# Altium footprint library Circuitos Integrados.PcbLib: 81 footprints (part 4 of 6)
Each footprint in its own frame and in the unit in brackets; x right, y up, seen from the top. Pads: shape width x height; smd on the part's side, far side on the other; paste and mask are expansions set on the pad; w line width, h text height; cw(c..) or ccw(c..) is an arc to the next point about the centre after c.
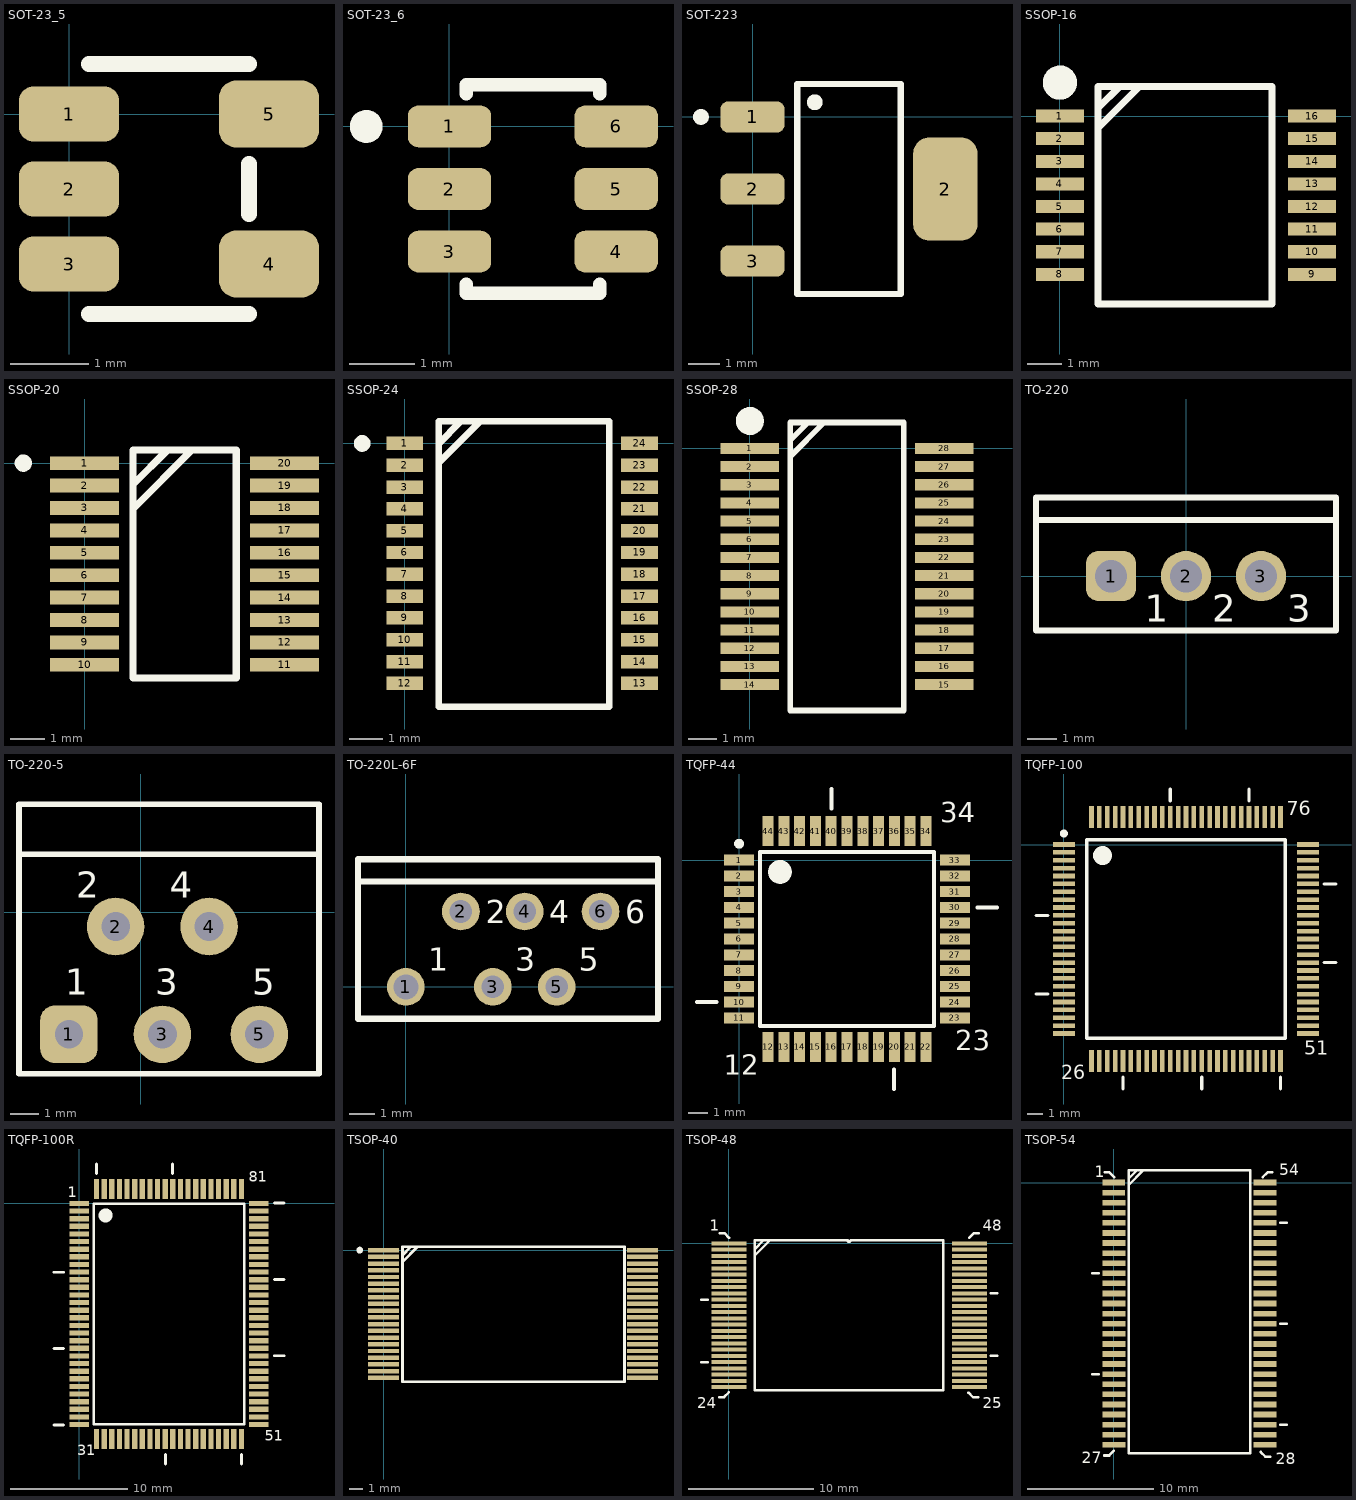
[diagram p3: the footprints below, top view; thin cyan lines are the x and y axes]

## SOT-23_5 [mm] "SOT-23, 5-Pins"
pads (5):
  rrect50% 1.27x0.7 smd: 1(0,0) 2(0,-0.953) 3(0,-1.905)
  rrect50% 1.27x0.85 smd: 4(2.54,-1.905) 5(2.54,0)
Top Overlay:
  lines w0.203: 0.254,-2.54 2.286,-2.54 ; 0.254,0.635 2.286,0.635 ; 2.286,-1.27 2.286,-0.635
3D body "SOT-23_5.STEP": height 1.1, standoff 0, extent -0.15,-2.4 2.65,0.499

## SOT-23_6 [mil] "SOT-23, 6-Pins"
pads (6):
  rrect50% 50x25 smd: 1(0,0) 2(0,-37.5) 3(0,-75) 4(100,-75) 5(100,-37.5) 6(100,0)
Top Overlay:
  circle w9.84: c-49.92,0 r4.92
  lines w8: 10,-94.69 10,-100 90,-100 90,-94.69 ; 10,19.68 10,25 90,25 90,19.68
3D body "SOT-23_6.STEP": height 43, standoff 0, extent 2.45,-92.52 97.95,17.48

## SOT-223 [mm] "SOT223, 4-Leads, Pitch 2,30mm,"
height 1.8
pads (4):
  rrect50% 2.05x1 smd: 1(0,0) 2(0,-2.3) 3(0,-4.6)
  rrect50% 2.05x3.3 smd: 2(6.15,-2.3)
Top Overlay:
  circle w0.25: c1.985,0.469 r0.125
  circle w0.25: c-1.649,0 r0.125
  lines w0.2: 1.425,-5.65 1.425,1.05 4.725,1.05 4.725,-5.65 1.425,-5.65
3D body "SOT-223.STEP": height 1.64, standoff -0.04, extent -0.442,-5.55 6.49,0.95

## SSOP-16 [mil]
pads (16):
  rect 55x15 smd: 1(0,0) 2(0,-26) 3(0,-52) 4(0,-78) 5(0,-104) 6(0,-130) 7(0,-156) 8(0,-182) 9(290,-182) 10(290,-156) 11(290,-130) 12(290,-104) 13(290,-78) 14(290,-52) 15(290,-26) 16(290,0)
Top Overlay:
  circle w19.68: c0,38.51 r9.84
  lines w8: 44,-13.48 91.48,34 ; 44,9.16 68.84,34 ; 44,-216 244,-216 244,34 44,34 44,-216
3D body "SSOP-16.STEP": height 78, standoff 0, extent -6.88,-214.51 304.12,34.45

## SSOP-20 [mm]
pads (20):
  rect 2x0.4 smd: 1(0,0) 2(0,-0.65) 3(0,-1.3) 4(0,-1.95) 5(0,-2.6) 6(0,-3.25) 7(0,-3.9) 8(0,-4.55) 9(0,-5.2) 10(0,-5.85) 11(5.8,-5.85) 12(5.8,-5.2) 13(5.8,-4.55) 14(5.8,-3.9) 15(5.8,-3.25) 16(5.8,-2.6) 17(5.8,-1.95) 18(5.8,-1.3) 19(5.8,-0.65) 20(5.8,0)
Top Overlay:
  circle w0.25: c-1.776,0 r0.125
  lines w0.203: 1.4,-1.325 3.1,0.375 ; 1.4,-0.625 2.4,0.375 ; 1.4,-6.225 1.4,0.375 4.4,0.375 4.4,-6.225 1.4,-6.225
3D body "TSSOP-20.STEP": height 0.97, standoff -0.03, extent -0.305,-6.175 6.105,0.325

## SSOP-24 [mm] "SSOP, 24-Leads, Body 8,7x5,4mm (max), Pitch 0,65mm, IPC Medium Density"
height 2
pads (24):
  rect 1.1x0.4 smd: 1(0,0) 2(0,-0.65) 3(0,-1.3) 4(0,-1.951) 5(0,-2.601) 6(0,-3.251) 7(0,-3.901) 8(0,-4.552) 9(0,-5.202) 10(0,-5.852) 11(0,-6.502) 12(0,-7.153) 13(7,-7.153) 14(7,-6.502) 15(7,-5.852) 16(7,-5.202) 17(7,-4.552) 18(7,-3.901) 19(7,-3.251) 20(7,-2.601) 21(7,-1.951) 22(7,-1.3) 23(7,-0.65) 24(7,0)
Top Overlay:
  circle w0.25: c-1.268,0 r0.125
  lines w0.203: 1.016,-0.571 2.222,0.635 ; 1.016,0.004 1.647,0.635 ; 1.016,-7.849 1.016,0.66 6.096,0.66 6.096,-7.849 1.016,-7.849
3D body "User Library-SOT340-1.STEP": height 1.85, standoff -0.05, extent -0.269,-7.698 7.28,0.535

## SSOP-28 [mm]
pads (28):
  rect 2.1x0.4 smd: 1(0,0) 2(0,-0.65) 3(0,-1.3) 4(0,-1.95) 5(0,-2.6) 6(0,-3.25) 7(0,-3.9) 8(0,-4.55) 9(0,-5.2) 10(0,-5.85) 11(0,-6.5) 12(0,-7.15) 13(0,-7.8) 14(0,-8.45) 15(6.95,-8.45) 16(6.95,-7.8) 17(6.95,-7.15) 18(6.95,-6.5) 19(6.95,-5.85) 20(6.95,-5.2) 21(6.95,-4.55) 22(6.95,-3.9) 23(6.95,-3.25) 24(6.95,-2.6) 25(6.95,-1.95) 26(6.95,-1.3) 27(6.95,-0.65) 28(6.95,0)
Top Overlay:
  circle w0.5: c0,0.978 r0.25
  lines w0.203: 1.45,-0.281 2.656,0.925 ; 1.45,0.294 2.081,0.925 ; 1.45,-9.375 5.5,-9.375 5.5,0.925 1.45,0.925 1.45,-9.375
3D body "SSOP-28.stp": height 1.95, standoff 0, extent -0.656,-9.492 7.569,1.008

## TO-220 [mm] "TO, Thru-Hole, Vertical, Heatsink Mounted; 3 In-Line Leads; Pitch 2.54 mm"
height 22.9
pads (3):
  rrect50% 1.7x1.7 hole 1.1: 1(-2.54,0)
  round 1.7 hole 1.1: 2(0,0) 3(2.54,0)
Top Overlay:
  lines w0.2: -5.08,1.905 5.08,1.905 ; -5.08,-1.85 -5.08,2.667 5.08,2.667 5.08,-1.85 -5.08,-1.85
  text "3" at 3.437,-1.539 h0.91
  text "2" at 0.897,-1.539 h0.91
  text "1" at -1.393,-1.539 h0.91
3D body "TO-220-4.STEP": height 20.06, standoff -8.74, extent -5.1,-1.833 5.1,2.667

## TO-220-5 [mil]
height 598.43
pads (5):
  rrect50% 80x80 hole 39.37: 1(-100,-170)
  round 80 hole 40: 2(-35,-20) 3(30,-170) 4(95,-20) 5(165,-170)
Top Overlay:
  lines w7.87: -169.45,80.55 247.87,80.55 ; -169.45,-225 -169.45,150.24 247.87,150.24 247.87,-225 -169.45,-225
  text "4" at 40,20 h36
  text "3" at 20,-115 h36
  text "2" at -90,20 h36
  text "5" at 155,-115 h36
  text "1" at -105,-115 h36
3D body "TO220-5.STEP": height 840.55, standoff -103.94, extent -170,-174.41 230,150

## TO-220L-6F [mm]
pads (6):
  round 1.5 hole 1: 1(0,0)
  round 1.5 hole 0.9: 2(2.19,3) 3(3.46,0) 4(4.73,3) 5(6,0) 6(7.747,3)
Top Overlay:
  lines w0.254: 10.033,4.191 -1.905,4.191 ; -1.905,4.191 -1.905,5.08 10.033,5.08 10.033,3.429 10.033,-1.27 -1.905,-1.27 -1.905,4.191
  text "6" at 8.732,2.54 h0.91
  text "4" at 5.715,2.54 h0.91
  text "2" at 3.175,2.54 h0.91
  text "3" at 4.349,0.635 h0.91
  text "5" at 6.889,0.635 h0.91
  text "1" at 0.889,0.635 h0.91

## TQFP-44 [mm] "TQFP, 44-Leads, Body 12,2x12,2mm (max), Pitch 0,80mm, IPC Medium Density"
height 1.2
pads (44):
  rect 1.52x0.56 smd: 1(0,0) 2(0,-0.8) 3(0,-1.6) 4(0,-2.4) 5(0,-3.2) 6(0,-4) 7(0,-4.8) 8(0,-5.6) 9(0,-6.4) 10(0,-7.2) 11(0,-8) 23(10.94,-8) 24(10.94,-7.2) 25(10.94,-6.4) 26(10.94,-5.6) 27(10.94,-4.8) 28(10.94,-4) 29(10.94,-3.2) 30(10.94,-2.4) 31(10.94,-1.6) 32(10.94,-0.8) 33(10.94,0)
  rect 0.56x1.52 smd: 12(1.47,-9.47) 13(2.27,-9.47) 14(3.07,-9.47) 15(3.87,-9.47) 16(4.67,-9.47) 17(5.47,-9.47) 18(6.27,-9.47) 19(7.07,-9.47) 20(7.87,-9.47) 21(8.67,-9.47) 22(9.47,-9.47) 34(9.47,1.47) 35(8.67,1.47) 36(7.87,1.47) 37(7.07,1.47) 38(6.27,1.47) 39(5.47,1.47) 40(4.67,1.47) 41(3.87,1.47) 42(3.07,1.47) 43(2.27,1.47) 44(1.47,1.47)
Top Overlay:
  circle w0.6: c2.07,-0.6 r0.3
  circle w0.25: c0,0.83 r0.125
  lines w0.2: 1.07,-8.4 9.87,-8.4 9.87,0.4 1.07,0.4 1.07,-8.4
  lines w0.203: -2.134,-7.188 -1.143,-7.188 ; 4.682,2.613 4.682,3.604 ; 7.858,-11.604 7.858,-10.613 ; 12.083,-2.412 13.074,-2.412
  text "34" at 10.185,1.93 h1.02
  text "23" at 10.947,-9.652 h1.02
  text "12" at -0.787,-10.871 h1.02
3D body "User Library-TQFP-44-1.STEP": height 1.1, standoff 0, extent -0.533,-9.988 11.467,2.012

## TQFP-100 [mm] "TQFP, 100-Leads, Body 16mm x 16mm x 1.6mm, Pitch 0,50mm"
height 1.6
pads (100):
  rect 1.4x0.3 smd: 1(0,0) 2(0,-0.5) 3(0,-1) 4(0,-1.5) 5(0,-2) 6(0,-2.5) 7(0,-3) 8(0,-3.5) 9(0,-4) 10(0,-4.5) 11(0,-5) 12(0,-5.5) 13(0,-6) 14(0,-6.5) 15(0,-7) 16(0,-7.5) 17(0,-8) 18(0,-8.5) 19(0,-9) 20(0,-9.5) 21(0,-10) 22(0,-10.5) 23(0,-11) 24(0,-11.5) 25(0,-12) 51(15.5,-12) 52(15.5,-11.5) 53(15.5,-11) 54(15.5,-10.5) 55(15.5,-10) 56(15.5,-9.5) 57(15.5,-9) 58(15.5,-8.5) 59(15.5,-8) 60(15.5,-7.5) 61(15.5,-7) 62(15.5,-6.5) 63(15.5,-6) 64(15.5,-5.5) 65(15.5,-5) 66(15.5,-4.5) 67(15.5,-4) 68(15.5,-3.5) 69(15.5,-3) 70(15.5,-2.5) 71(15.5,-2) 72(15.5,-1.5) 73(15.5,-1) 74(15.5,-0.5) 75(15.5,0)
  rect 0.3x1.4 smd: 26(1.75,-13.75) 27(2.25,-13.75) 28(2.75,-13.75) 29(3.25,-13.75) 30(3.75,-13.75) 31(4.25,-13.75) 32(4.75,-13.75) 33(5.25,-13.75) 34(5.75,-13.75) 35(6.25,-13.75) 36(6.75,-13.75) 37(7.25,-13.75) 38(7.75,-13.75) 39(8.25,-13.75) 40(8.75,-13.75) 41(9.25,-13.75) 42(9.75,-13.75) 43(10.25,-13.75) 44(10.75,-13.75) 45(11.25,-13.75) 46(11.75,-13.75) 47(12.25,-13.75) 48(12.75,-13.75) 49(13.25,-13.75) 50(13.75,-13.75) 76(13.75,1.75) 77(13.25,1.75) 78(12.75,1.75) 79(12.25,1.75) 80(11.75,1.75) 81(11.25,1.75) 82(10.75,1.75) 83(10.25,1.75) 84(9.75,1.75) 85(9.25,1.75) 86(8.75,1.75) 87(8.25,1.75) 88(7.75,1.75) 89(7.25,1.75) 90(6.75,1.75) 91(6.25,1.75) 92(5.75,1.75) 93(5.25,1.75) 94(4.75,1.75) 95(4.25,1.75) 96(3.75,1.75) 97(3.25,1.75) 98(2.75,1.75) 99(2.25,1.75) 100(1.75,1.75)
Top Overlay:
  circle w0.25: c0,0.7 r0.125
  circle w0.6: c2.45,-0.7 r0.3
  lines w0.2: 1.45,-12.3 1.45,0.3 14.05,0.3 14.05,-12.3 1.45,-12.3
  lines w0.203: -1.775,-9.501 -1.013,-9.501 ; -1.775,-4.501 -1.013,-4.501 ; 3.751,-15.525 3.751,-14.763 ; 6.749,2.763 6.749,3.525 ; 8.751,-15.525 8.751,-14.763 ; 11.749,2.763 11.749,3.525 ; 13.751,-15.525 13.751,-14.763 ; 16.513,-7.499 17.275,-7.499 ; 16.513,-2.499 17.275,-2.499
  text "26" at -0.175,-14.915 h0.89
  text "51" at 15.268,-13.341 h0.89
  text "76" at 14.151,1.849 h0.89
3D body "SW3dPS-TQFP100-1.STEP": height 1.61, standoff -0.01, extent -0.251,-13.999 15.749,2.001

## TQFP-100R [mm] "TQFP, 100-Leads, Body 22mm x 16mm x 1.6mm, Pitch 0,65mm"
height 1.6
pads (100):
  rect 1.7x0.45 smd: 1(0,0) 2(0,-0.65) 3(0,-1.3) 4(0,-1.95) 5(0,-2.6) 6(0,-3.25) 7(0,-3.9) 8(0,-4.55) 9(0,-5.2) 10(0,-5.85) 11(0,-6.5) 12(0,-7.15) 13(0,-7.8) 14(0,-8.45) 15(0,-9.1) 16(0,-9.75) 17(0,-10.4) 18(0,-11.05) 19(0,-11.7) 20(0,-12.35) 21(0,-13) 22(0,-13.65) 23(0,-14.3) 24(0,-14.95) 25(0,-15.6) 26(0,-16.25) 27(0,-16.9) 28(0,-17.55) 29(0,-18.2) 30(0,-18.85) 51(15.3,-18.85) 52(15.3,-18.2) 53(15.3,-17.55) 54(15.3,-16.9) 55(15.3,-16.25) 56(15.3,-15.6) 57(15.3,-14.95) 58(15.3,-14.3) 59(15.3,-13.65) 60(15.3,-13) 61(15.3,-12.35) 62(15.3,-11.7) 63(15.3,-11.05) 64(15.3,-10.4) 65(15.3,-9.75) 66(15.3,-9.1) 67(15.3,-8.45) 68(15.3,-7.8) 69(15.3,-7.15) 70(15.3,-6.5) 71(15.3,-5.85) 72(15.3,-5.2) 73(15.3,-4.55) 74(15.3,-3.9) 75(15.3,-3.25) 76(15.3,-2.6) 77(15.3,-1.95) 78(15.3,-1.3) 79(15.3,-0.65) 80(15.3,0)
  rect 0.45x1.7 smd: 31(1.475,-20.075) 32(2.125,-20.075) 33(2.775,-20.075) 34(3.425,-20.075) 35(4.075,-20.075) 36(4.725,-20.075) 37(5.375,-20.075) 38(6.025,-20.075) 39(6.675,-20.075) 40(7.325,-20.075) 41(7.975,-20.075) 42(8.625,-20.075) 43(9.275,-20.075) 44(9.925,-20.075) 45(10.575,-20.075) 46(11.225,-20.075) 47(11.875,-20.075) 48(12.525,-20.075) 49(13.175,-20.075) 50(13.825,-20.075) 81(13.825,1.225) 82(13.175,1.225) 83(12.525,1.225) 84(11.875,1.225) 85(11.225,1.225) 86(10.575,1.225) 87(9.925,1.225) 88(9.275,1.225) 89(8.625,1.225) 90(7.975,1.225) 91(7.325,1.225) 92(6.675,1.225) 93(6.025,1.225) 94(5.375,1.225) 95(4.725,1.225) 96(4.075,1.225) 97(3.425,1.225) 98(2.775,1.225) 99(2.125,1.225) 100(1.475,1.225)
Top Overlay:
  circle w0.6: c2.25,-1.025 r0.3
  lines w0.2: 1.25,-18.825 1.25,-0.025 14.05,-0.025 14.05,-18.825 1.25,-18.825
  lines w0.254: -2.134,-18.867 -1.321,-18.867 ; -2.134,-12.367 -1.321,-12.367 ; -2.134,-5.867 -1.321,-5.867 ; 1.458,2.546 1.458,3.359 ; 7.342,-22.209 7.342,-21.396 ; 7.958,2.546 7.958,3.359 ; 13.842,-22.209 13.842,-21.396 ; 16.621,-12.983 17.434,-12.983 ; 16.621,-6.483 17.434,-6.483 ; 16.621,0.017 17.434,0.017
  text "1" at -0.991,0.508 h0.89
  text "81" at 14.453,1.829 h0.89
  text "51" at 15.799,-20.244 h0.89
  text "31" at -0.178,-21.463 h0.89
3D body "tqfp-100-1.6mm.stp": height 1.55, standoff -0.1, extent -0.254,-20.327 15.546,1.473

## TSOP-40 [mil]
pads (40):
  rect 90x13 smd: 1(0,0) 2(0,-19.68) 3(0,-39.37) 4(0,-59.05) 5(0,-78.74) 6(0,-98.42) 7(0,-118.11) 8(0,-137.79) 9(0,-157.48) 10(0,-177.16) 11(0,-196.85) 12(0,-216.53) 13(0,-236.22) 14(0,-255.91) 15(0,-275.59) 16(0,-295.27) 17(0,-314.96) 18(0,-334.64) 19(0,-354.33) 20(0,-374.01) 21(757.87,-374.01) 22(757.87,-354.33) 23(757.87,-334.64) 24(757.87,-314.96) 25(757.87,-295.27) 26(757.87,-275.59) 27(757.87,-255.91) 28(757.87,-236.22) 29(757.87,-216.53) 30(757.87,-196.85) 31(757.87,-177.16) 32(757.87,-157.48) 33(757.87,-137.79) 34(757.87,-118.11) 35(757.87,-98.42) 36(757.87,-78.74) 37(757.87,-59.05) 38(757.87,-39.37) 39(757.87,-19.68) 40(757.87,0)
Top Overlay:
  circle w9.84: c-70,0 r4.92
  lines w8: 55,-35 100,10 ; 55,-15 80,10 ; 55,-385 705,-385 705,10 55,10 55,-385

## TSOP-48 [mm]
pads (48):
  rect 2.8x0.33 smd: 1(0,0) 2(0,-0.5) 3(0,-1) 4(0,-1.5) 5(0,-2) 6(0,-2.5) 7(0,-3) 8(0,-3.5) 9(0,-4) 10(0,-4.5) 11(0,-5) 12(0,-5.5) 13(0,-6) 14(0,-6.5) 15(0,-7) 16(0,-7.5) 17(0,-8) 18(0,-8.5) 19(0,-9) 20(0,-9.5) 21(0,-10) 22(0,-10.5) 23(0,-11) 24(0,-11.5) 25(19.25,-11.5) 26(19.25,-11) 27(19.25,-10.5) 28(19.25,-10) 29(19.25,-9.5) 30(19.25,-9) 31(19.25,-8.5) 32(19.25,-8) 33(19.25,-7.5) 34(19.25,-7) 35(19.25,-6.5) 36(19.25,-6) 37(19.25,-5.5) 38(19.25,-5) 39(19.25,-4.5) 40(19.25,-4) 41(19.25,-3.5) 42(19.25,-3) 43(19.25,-2.5) 44(19.25,-2) 45(19.25,-1.5) 46(19.25,-1) 47(19.25,-0.5) 48(19.25,0)
Top Overlay:
  lines w0.2: 2.085,-0.955 3.29,0.25 ; 2.085,-0.447 2.782,0.25
  lines w0.203: -2.204,-9.5 -1.696,-9.5 ; -2.204,-4.5 -1.696,-4.5 ; -0.762,-12.295 -0.381,-12.295 0,-11.914 ; -0.737,0.813 -0.356,0.813 0.025,0.432 ; 19.174,-11.939 19.555,-12.32 19.936,-12.32 ; 19.225,0.432 19.606,0.813 19.987,0.813 ; 20.946,-9 21.454,-9 ; 20.946,-4 21.454,-4 ; 2.085,-11.75 17.165,-11.75 17.165,0.25 9.75,0.25 cw(c9.625,0.25) 9.5,0.25 2.085,0.25 2.085,-11.75
  text "24" at -2.54,-13.208 h0.89
  text "1" at -1.524,1.016 h0.89
  text "25" at 20.32,-13.208 h0.89
  text "48" at 20.32,1.016 h0.89
3D body "TSOP-48.STEP": height 1.2, standoff -0.06, extent -0.425,-11.8 19.675,0.3

## TSOP-54 [mm]
pads (54):
  rect 1.8x0.45 smd: 1(0.01,0) 2(0.01,-0.8) 3(0.02,-1.6) 4(0.02,-2.4) 5(0.02,-3.2) 6(0.02,-4) 7(0.02,-4.8) 8(0.02,-5.6) 9(0.02,-6.4) 10(0.02,-7.2) 11(0.02,-8) 12(0.02,-8.8) 13(0.02,-9.6) 14(0.02,-10.4) 15(0.02,-11.2) 16(0.02,-12) 17(0.02,-12.8) 18(0.02,-13.6) 19(0.02,-14.4) 20(0.02,-15.2) 21(0.02,-16) 22(0.02,-16.8) 23(0.02,-17.6) 24(0.02,-18.4) 25(0.02,-19.2) 26(0.02,-20) 27(0.02,-20.8) 28(12.01,-20.8) 29(12.01,-20) 30(12.01,-19.2) 31(12.01,-18.4) 32(12.01,-17.6) 33(12.01,-16.8) 34(12.01,-16) 35(12.01,-15.2) 36(12.01,-14.4) 37(12.01,-13.6) 38(12.01,-12.8) 39(12.01,-12) 40(12.01,-11.2) 41(12.01,-10.4) 42(12.01,-9.6) 43(12.01,-8.8) 44(12.01,-8) 45(12.01,-7.2) 46(12.01,-6.4) 47(12.01,-5.6) 48(12.01,-4.8) 49(12.01,-4) 50(12.01,-3.2) 51(12.01,-2.4) 52(12.01,-1.6) 53(12.01,-0.8) 54(12.01,0)
Top Overlay:
  lines w0.203: -1.702,-15.2 -1.194,-15.2 ; -1.702,-7.2 -1.194,-7.2 ; -0.747,-21.65 -0.366,-21.65 0.015,-21.269 ; -0.727,0.813 -0.346,0.813 0.035,0.432 ; 1.194,-0.178 2.337,0.965 ; 1.194,0.33 1.829,0.965 ; 11.655,-21.369 12.036,-21.75 12.417,-21.75 ; 11.825,0.432 12.206,0.813 12.587,0.813 ; 13.224,-19.2 13.732,-19.2 ; 13.224,-11.2 13.732,-11.2 ; 13.224,-3.2 13.732,-3.2 ; 1.194,-21.488 10.846,-21.488 10.846,0.965 1.194,0.965 1.194,-21.488
  text "27" at -2.54,-22.276 h0.89
  text "1" at -1.489,0.432 h0.89
  text "28" at 12.852,-22.327 h0.89
  text "54" at 13.123,0.584 h0.89